# Altium footprint library CAP_TH.PcbLib: 219 footprints (part 3 of 14)
Each footprint in its own frame and in the unit in brackets; x right, y up, seen from the top. Pads: shape width x height; smd on the part's side, far side on the other; paste and mask are expansions set on the pad; w line width, h text height; cw(c..) or ccw(c..) is an arc to the next point about the centre after c.
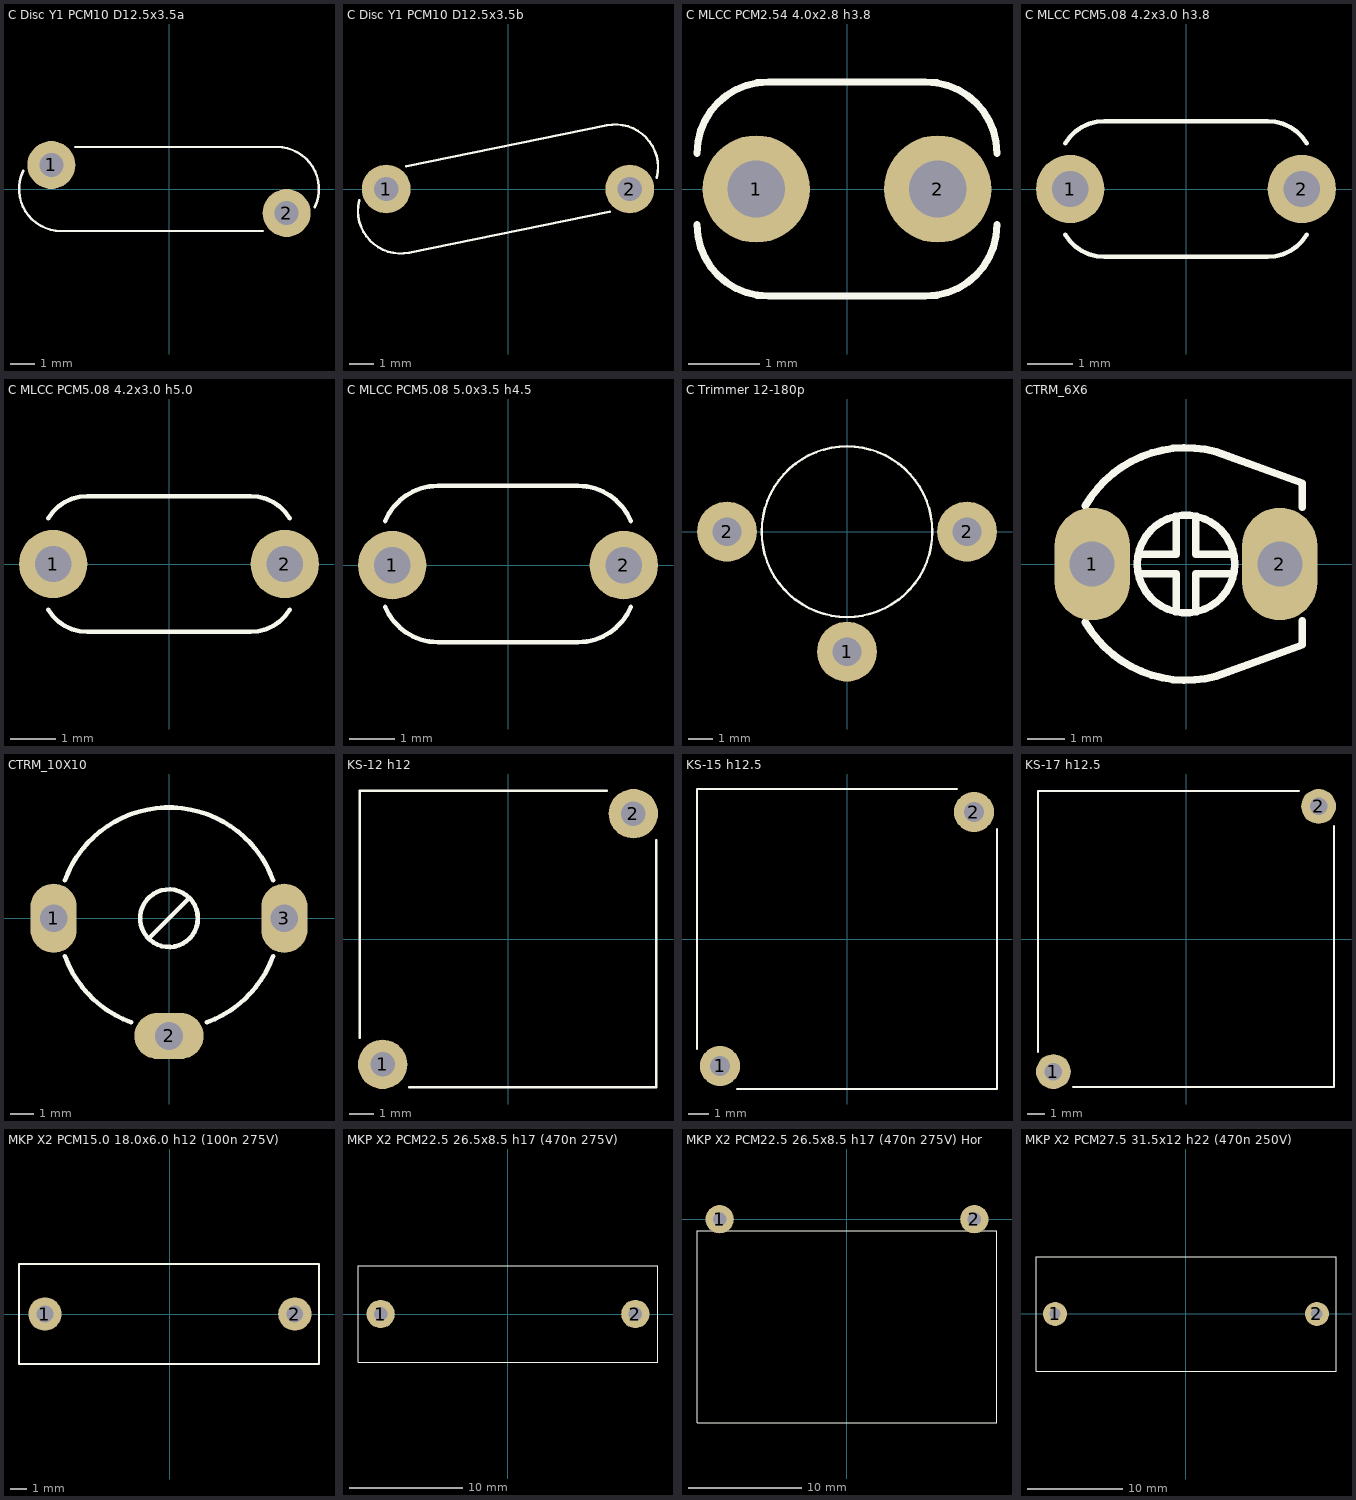
[diagram p2: the footprints below, top view; thin cyan lines are the x and y axes]

## C Disc Y1 PCM10 D12.5x3.5a [mm]
pads (2):
  round 2 hole 1: 1(-4.9,1) 2(4.9,-1)
Top Overlay:
  lines w0.1: -6.076,0.761 ccw(c-4.5,0) -4.5,-1.75 3.9,-1.75 ; -3.9,1.75 4.5,1.75 cw(c4.5,0) 6.076,-0.761
3D body "C Disc Y1 PCM10 D12.5x3.5(2.0).STEP": height 14.5, standoff -1.98, extent -6.247,-1.75 6.248,1.75

## C Disc Y1 PCM10 D12.5x3.5b [mm]
pads (2):
  round 2 hole 1: 1(-5,0) 2(5,0)
Top Overlay:
  lines w0.1: -6.105,-0.47 ccw(c-4.409,-0.9) -4.059,-2.615 4.171,-0.934 ; -4.171,0.934 4.059,2.615 cw(c4.409,0.9) 6.105,0.47
3D body "C Disc Y1 PCM10 D12.5x3.5(2.0).STEP": height 14.5, standoff -1.98, extent -6.471,-2.964 6.472,2.965

## C MLCC PCM2.54 4.0x2.8 h3.8 [mm]
pads (2):
  round 1.5 hole 0.8: 1(-1.27,0) 2(1.27,0)
Top Overlay:
  lines w0.1: -2.1,-0.5 ccw(c-1.1,-0.5) -1.1,-1.5 1.1,-1.5 ccw(c1.1,-0.5) 2.1,-0.5 ; -2.1,0.5 cw(c-1.1,0.5) -1.1,1.5 1.1,1.5 cw(c1.1,0.5) 2.1,0.5
3D body "C MLCC PCM2.54 4.0x2.8 h3.8.STEP": height 5.08, standoff -2, extent -2.1,-1.494 2.1,1.494

## C MLCC PCM5.08 4.2x3.0 h3.8 [mm]
pads (2):
  round 1.5 hole 0.8: 1(-2.54,0) 2(2.54,0)
Top Overlay:
  lines w0.1: -2.65,-1 ccw(c-1.79,-0.489) -1.79,-1.489 1.79,-1.489 ccw(c1.79,-0.489) 2.65,-1 ; -2.65,1 cw(c-1.79,0.489) -1.79,1.489 1.79,1.489 cw(c1.79,0.489) 2.65,1
3D body "C MLCC PCM5.08 4.2x3.0 h3.8.STEP": height 5.35, standoff -1.89, extent -2.79,-1.484 2.79,1.489

## C MLCC PCM5.08 4.2x3.0 h5.0 [mm]
pads (2):
  round 1.5 hole 0.8: 1(-2.54,0) 2(2.54,0)
Top Overlay:
  lines w0.1: -2.65,-1 ccw(c-1.79,-0.489) -1.79,-1.489 1.79,-1.489 ccw(c1.79,-0.489) 2.65,-1 ; -2.65,1 cw(c-1.79,0.489) -1.79,1.489 1.79,1.489 cw(c1.79,0.489) 2.65,1
3D body "C MLCC PCM5.08 4.2x3.0 h5.0.STEP": height 5.95, standoff -1.89, extent -2.79,-1.479 2.79,1.479

## C MLCC PCM5.08 5.0x3.5 h4.5 [mm]
pads (2):
  round 1.5 hole 0.8: 1(-2.54,0) 2(2.54,0)
Top Overlay:
  lines w0.1: -2.694,-0.918 ccw(c-1.54,-0.439) -1.54,-1.689 1.54,-1.689 ccw(c1.54,-0.439) 2.694,-0.918 ; -2.694,0.968 cw(c-1.54,0.489) -1.54,1.739 1.54,1.739 cw(c1.54,0.489) 2.694,0.968
3D body "C MLCC PCM5.08 5.0x3.5 h4.5.STEP": height 5.7, standoff -1.89, extent -2.79,-1.741 2.79,1.741

## C Trimmer 12-180p [mm]
pads (3):
  round 2.5 hole 1.2: 1(0,-5) 2(-5,0) 2(5,0)
Top Overlay:
  circle w0.1: c0,0 r3.556
3D body "C Trimmer 12-180p.STEP": height 11.36, standoff -2.38, extent -5.029,-5.944 5.029,4.699

## CTRM_6X6 [mm] "CAP, TRIMMER, Murata TZ03"
pads (2):
  oval 2x3 hole 1.2: 1(-2.5,0) 2(2.5,0)
Top Overlay:
  circle w0.2: c0,0 r1.3
  lines w0.2: -2.685,-1.55 ccw(c0,0) 0.802,-2.994 3.1,-2.158 3.1,-1.519 ; -2.685,1.55 cw(c0,0) 0.802,2.994 3.1,2.158 3.1,1.519 ; -1.27,-0.254 -0.254,-0.254 -0.254,-1.27 ; -1.27,0.254 -0.254,0.254 -0.254,1.27 ; 0.254,-1.27 0.254,-0.254 1.27,-0.254 ; 0.254,1.27 0.254,0.254 1.27,0.254
3D body "User Library-Murata TZ03.step": height 4.8, standoff -3.3, extent -3,-3 3,3

## CTRM_10X10 [mm] "CAP, TRIMMER, 10X10mm 3P"
pads (3):
  oval 2x3 hole 1.2: 1(-5,0) 3(5,0)
  oval 3x2 hole 1.2: 2(0,-5.1)
Top Overlay:
  circle w0.2: c0,0 r1.25
  lines w0.2: -4.511,-1.642 ccw(c0,0) -1.642,-4.511 ; -4.511,1.642 cw(c0,0) 4.511,1.642 ; -0.889,-0.889 0.889,0.889 ; 1.642,-4.511 ccw(c0,0) 4.511,-1.642
3D body "User Library-TRIMMER,CAP.step": height 11.26, standoff -2.48, extent -5.029,-5.943 5.029,4.699

## KS-12 h12 [mm]
pads (2):
  round 2 hole 1: 1(-5.08,-5.08) 2(5.08,5.08)
Top Overlay:
  lines w0.1: -6,-4 -6,6 4,6 ; -4,-6 6,-6 6,4
3D body "KS-12h12.5.STEP": height 12.5, standoff -1.1, extent -6,-6 6,6

## KS-15 h12.5 [mm]
pads (2):
  round 2 hole 1: 1(-6.35,-6.35) 2(6.35,6.35)
Top Overlay:
  lines w0.1: -7.5,-5.5 -7.5,7.5 5.5,7.5 ; -5.5,-7.5 7.5,-7.5 7.5,5.5
3D body "KS-15 h12.5.STEP": height 12.5, standoff -1.1, extent -7.5,-7.5 7.5,7.5

## KS-17 h12.5 [mm]
pads (2):
  round 2 hole 1: 1(-7.62,-7.62) 2(7.62,7.62)
Top Overlay:
  lines w0.1: -8.5,-6.5 -8.5,8.5 6.493,8.5 ; -6.5,-8.5 8.5,-8.5 8.5,6.493
3D body "KS-17 h12.5.STEP": height 12.5, standoff -1.1, extent -8.5,-8.5 8.5,8.5

## MKP X2 PCM15.0 18.0x6.0 h12 (100n 275V) [mm]
pads (2):
  round 2 hole 1: 1(-7.5,0) 2(7.5,0)
Top Overlay:
  lines w0.1: -9.06,-3 8.95,-3 8.95,3 -9.06,3 -9.06,-3
3D body "MKP X2 PCM15 18x6 h12 (100nF 275V).STEP": height 12, standoff -2, extent -9,-3.01 9,3

## MKP X2 PCM22.5 26.5x8.5 h17 (470n 275V) [mm]
pads (2):
  round 2.5 hole 1.2: 1(-11.25,0) 2(11.25,0)
Top Overlay:
  lines w0.1: -13.25,-4.25 13.25,-4.25 13.25,4.25 -13.25,4.25 -13.25,-4.25
3D body "MKP X2 PCM22.5 26.5x8.5 h17 (0.47n 275V).STEP": height 17, standoff -2, extent -13.25,-4.26 13.25,4.25

## MKP X2 PCM22.5 26.5x8.5 h17 (470n 275V) Hor [mm]
pads (2):
  round 2.5 hole 1.2: 1(-11.25,0) 2(11.25,0)
Top Overlay:
  lines w0.1: -13.25,-18 -13.25,-1 13.25,-1 13.25,-18 -13.25,-18
3D body "MKP X2 PCM22.5  26.5x8.5 h17 (0.47n 275V) Hor.STEP": height 8.5, standoff -2.54, extent -13.25,-18 13.25,0.4

## MKP X2 PCM27.5 31.5x12 h22 (470n 250V) [mm]
pads (2):
  round 2.5 hole 1.2: 1(-13.75,0) 2(13.75,0)
Top Overlay:
  lines w0.1: -15.748,-6.01 -15.748,6 15.75,6 15.75,-6.01 -15.748,-6.01
3D body "MKP X2 PCM27.5 31.5x12 h22 (0.47n 250V).STEP": height 21, standoff -2, extent -15.75,-6.01 15.75,6